# Altium footprint library ATROTECH.PcbLib: 334 footprints (part 7 of 21)
Each footprint in its own frame and in the unit in brackets; x right, y up, seen from the top. Pads: shape width x height; smd on the part's side, far side on the other; paste and mask are expansions set on the pad; w line width, h text height; cw(c..) or ccw(c..) is an arc to the next point about the centre after c.
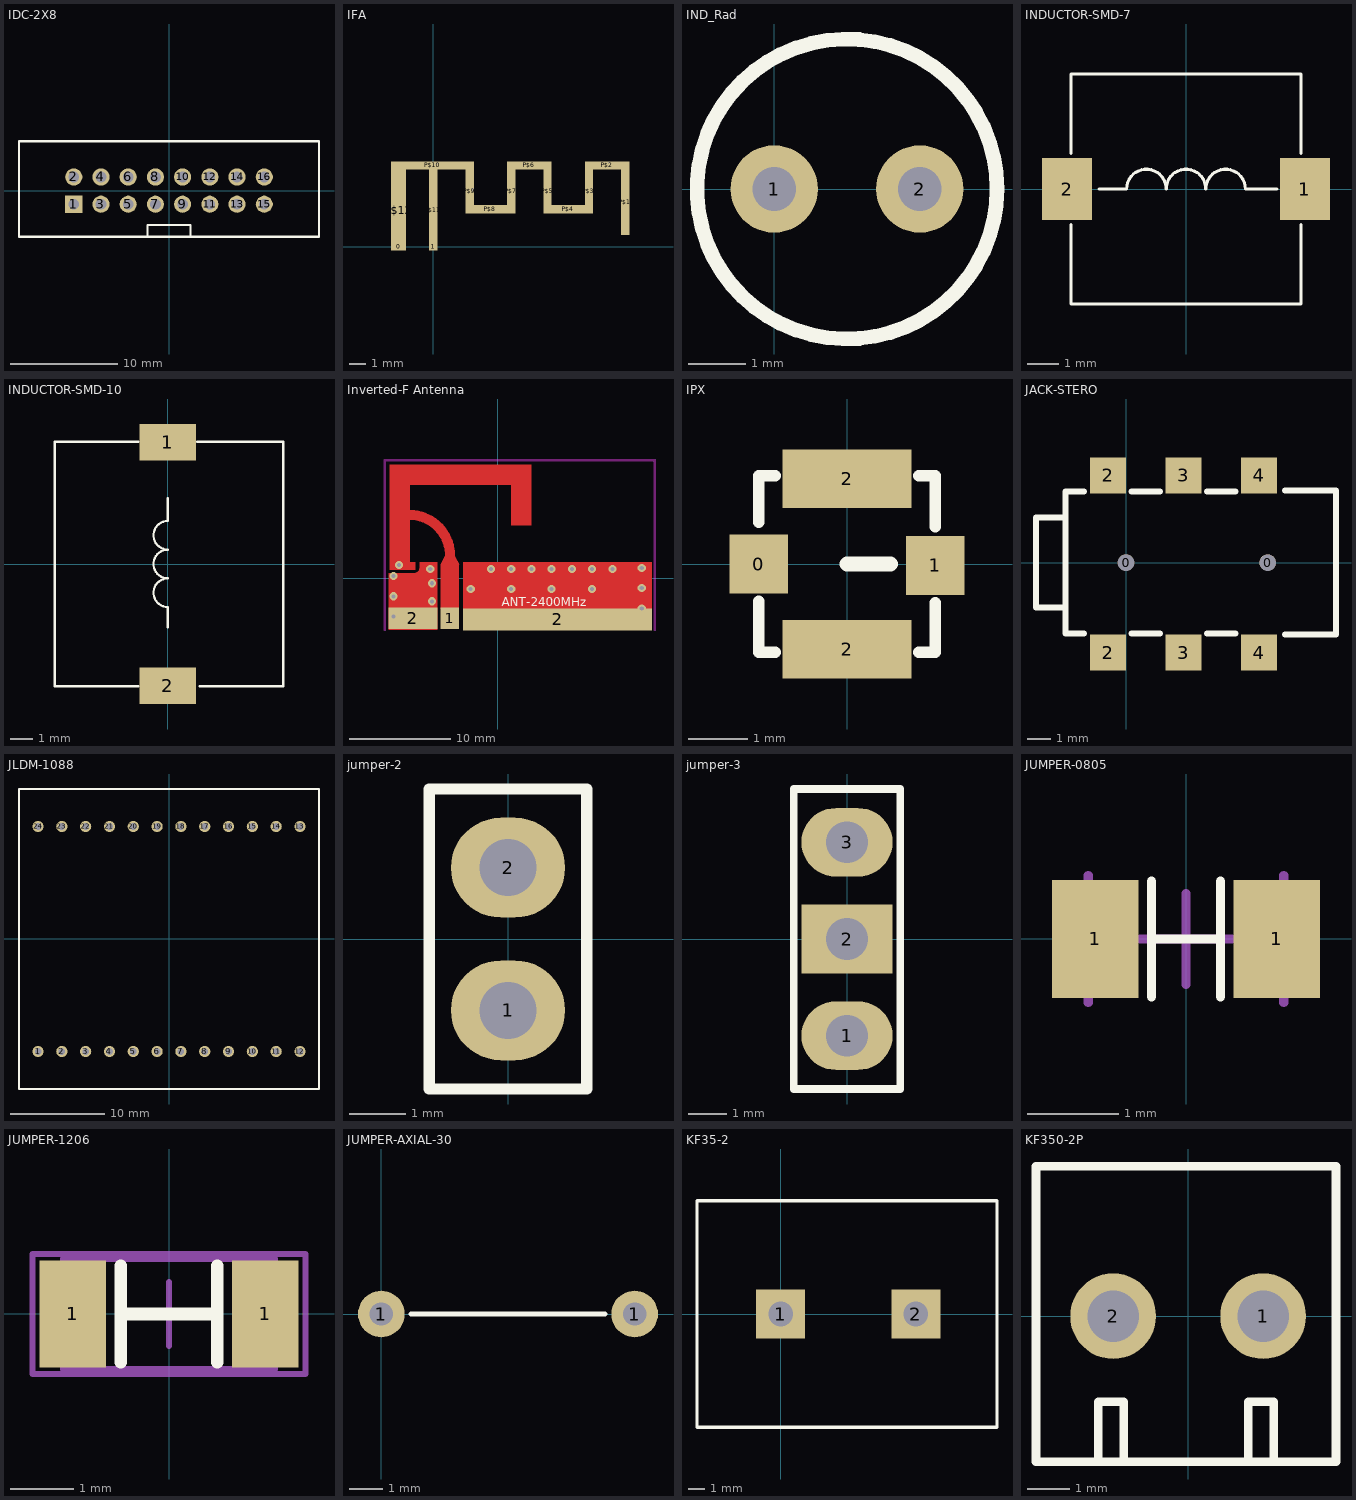
[diagram p6: the footprints below, top view; thin cyan lines are the x and y axes]

## IDC-2X8 [mm]
pads (16):
  rect 1.6x1.6 hole 1: 1(-8.89,-1.27)
  round 1.6 hole 1: 2(-8.89,1.27) 3(-6.35,-1.27) 4(-6.35,1.27) 5(-3.81,-1.27) 6(-3.81,1.27) 7(-1.27,-1.27) 8(-1.27,1.27) 9(1.27,-1.27) 10(1.27,1.27) 11(3.81,-1.27) 12(3.81,1.27) 13(6.35,-1.27) 14(6.35,1.27) 15(8.89,-1.27) 16(8.89,1.27)
Top Overlay:
  lines w0.2: -2,-4.3 -2,-3.2 2,-3.2 2,-4.3 ; -14,-4.3 13.991,-4.3 14,4.6 -14,4.6 -14,-4.3
3D body "User Library-IDC Socket Male 16pin Straight THT Goldplated 2_54mm.step": height 9.13, standoff -3.27, extent -13.96,-4.25 13.96,4.6

## IFA [mm]
pads (14):
  rect 0.9x0.5 smd: 0(-2.1,0)
  rect 0.5x0.5 smd: 1(0,0)
  rect 0.5x3.94 smd: P$1(11.6,2.68)
  rect 2.7x0.5 smd: P$2(10.5,4.9) P$6(5.8,4.9)
  rect 0.5x2.64 smd: P$3(9.4,3.33) P$5(6.9,3.33) P$7(4.7,3.33) P$9(2.2,3.33)
  rect 2x0.5 smd: P$4(8.15,2.26) P$8(3.45,2.26)
  rect 5x0.5 smd: P$10(-0.05,4.9)
  rect 0.5x4.9 smd: P$11(0,2.2)
  rect 0.9x4.9 smd: P$12(-2.1,2.2)

## IND_Rad [mil]
height 196.85
pads (2):
  round 60 hole 30: 1(0,0) 2(100,0)
Top Overlay:
  circle w10: c50,0 r102.96

## INDUCTOR-SMD-7 [mm] "7X7"
pads (2):
  rect 1.6x2 smd: 1(3.81,0) 2(-3.81,0)
Top Overlay:
  lines w0.1: -3.683,-1.143 -3.683,-3.683 3.683,-3.683 3.683,-1.143 ; -3.683,1.143 -3.683,3.683 3.683,3.683 3.683,1.143 ; -2.794,0 -1.905,0 cw(c-1.27,0) -0.635,0 cw(c0,0) 0.635,0 cw(c1.27,0) 1.905,0 2.921,0
3D body "CDRN74.stp": height 4.39, standoff -0.11, extent -3.65,-3.65 3.65,3.65

## INDUCTOR-SMD-10 [mm]
pads (2):
  rect 2.5x1.6 smd: 1(0,5.38) 2(0,-5.38)
Top Overlay:
  lines w0.1: -1.3,-5.4 -5,-5.4 -5,5.4 -1.3,5.4 ; 0,-2.794 0,-1.905 cw(c0,-1.27) 0,-0.635 cw(c0,0) 0,0.635 cw(c0,1.27) 0,1.905 0,2.921 ; 1.3,5.4 5.1,5.4 5.1,-5.4 1.4,-5.4
3D body "10x10mm.step": height 3.97, standoff 0.06, extent -5,-5.38 5,5.38

## Inverted-F Antenna [mil]
pads (3):
  rect 72.44x85.04 smd: 1(-186.51,-155)
  rect 190x85.04 smd: 2(-330,-155)
  rect 735.32x85.04 smd: 2(232.65,-160)
via -384.74,52.66 diameter 31.5 hole 15.75
via -255.91,-19.16 diameter 31.5 hole 15.75
via -262.69,36.91 diameter 31.5 hole 15.75
via -404.93,-148.49 diameter 31.5 hole 15.75
via -404.93,-69.75 diameter 31.5 hole 15.75
via -256.25,-89.19 diameter 31.5 hole 15.75
via -404.93,8.99 diameter 31.5 hole 15.75
via 560.14,-116.63 diameter 31.5 hole 15.75
via 367.23,-41.83 diameter 31.5 hole 15.75
via 209.75,-41.83 diameter 31.5 hole 15.75
via 52.27,-41.83 diameter 31.5 hole 15.75
via 560.14,-37.89 diameter 31.5 hole 15.75
via 52.27,36.91 diameter 31.5 hole 15.75
via 560.14,40.85 diameter 31.5 hole 15.75
via 445.97,36.91 diameter 31.5 hole 15.75
via 367.23,36.91 diameter 31.5 hole 15.75
via 288.49,36.91 diameter 31.5 hole 15.75
via 209.75,36.91 diameter 31.5 hole 15.75
via 131.01,36.91 diameter 31.5 hole 15.75
via -26.47,36.91 diameter 31.5 hole 15.75
via -105.21,-41.83 diameter 31.5 hole 15.75
Top Layer:
  region: 52.27,363.69 52.27,442.43 -420.17,442.43 -420.17,363.69
  region: -341.43,64.47 -341.43,363.69 -420.17,363.69 -420.17,64.47
  region: 131.01,206.21 131.01,442.43 52.27,442.43 52.27,206.21
  rectangle: -420.17,33.37 -320.96,64.47
  rectangle: -135,-200 600.3,64.47
  rectangle: -425,-200 -304.9,20
  rectangle: -304.9,-200 -235,64.47
  rectangle: -222.73,-120 -150.29,-49.17
  rectangle: -222.73,-49.17 -150.29,54.98
  region: -222.73,54.98 -205.72,86.48 -166.83,86.48 -150.29,54.98
  lines w10: -330,15 ccw(c-327.5,42.5) -300,40
  lines w39.37: -340.88,246.95 cw(c-343.48,89.49) -186.02,86.9
Top Overlay:
  text "ANT-2400MHz" at 15,-120 h59.06
Keep-Out Layer:
  lines w10: -440,-200 -440,460 610,460 610,-200

## IPX [mm]
pads (4):
  rect 1x1 smd: 0(-1.5,0) 1(1.5,-0.025)
  rect 2.2x1 smd: 2(0,-1.45) 2(0,1.45)
Top Overlay:
  lines w0.2: -1.5,-0.635 -1.5,-1.5 -1.221,-1.5 ; -1.5,0.711 -1.5,1.5 -1.221,1.5 ; 1.221,-1.5 1.5,-1.5 1.5,-0.66 ; 1.221,1.5 1.5,1.5 1.5,0.635
  lines w0.254: 0,0 0.737,0
3D body "SW3dPS-UFL-R-SMD.STEP": height 1.25, standoff 0, extent -1.55,-1.7 1.55,1.7

## JACK-STERO [mil]
pads (8):
  round 27.56 hole 27.56: 0(0,0) 0(236.22,0)
  rect 60x60 smd: 2(-30,-150) 2(-30,145.28) 3(95.98,-150) 3(95.98,145.28) 4(221.97,-150) 4(221.97,145.28)
Top Overlay:
  lines w10: -100.87,-75 -150,-75 -150,75 -100.87,75 ; -70.28,118.11 -100.87,118.11 -100.87,0 -100.87,-118.11 -70,-118.11 ; 9.09,118.11 56.34,118.11 ; 9.37,-118.11 56.61,-118.11 ; 135.08,118.11 182.32,118.11 ; 135.35,-118.11 182.6,-118.11 ; 265,-120 350,-120 350,120 265,120
3D body "User Library-audio_buchse.step": height 160, standoff -0.39, extent -160.63,-145 310.63,143.74

## JLDM-1088 [mm]
pads (24):
  round 1.2 hole 0.7: 1(-13.97,-12) 2(-11.43,-12) 3(-8.89,-12) 4(-6.35,-12) 5(-3.81,-12) 6(-1.27,-12) 7(1.27,-12) 8(3.81,-12) 9(6.35,-12) 10(8.89,-12) 11(11.43,-12) 12(13.97,-12) 13(13.97,12) 14(11.43,12) 15(8.89,12) 16(6.35,12) 17(3.81,12) 18(1.27,12) 19(-1.27,12) 20(-3.81,12) 21(-6.35,12) 22(-8.89,12) 23(-11.43,12) 24(-13.97,12)
Top Overlay:
  lines w0.2: -16,-16 -16,16 16,16 16,-16 -16,-16
3D body: height 6, standoff 0, extent -16,-16 16,16

## jumper-2 [mil]
pads (2):
  oval 80x70 hole 40: 1(0,-50) 2(0,50)
Top Overlay:
  lines w7.87: -55.12,-105.12 -55.12,105.12 55.12,105.12 55.12,-105.12 -55.12,-105.12
3D body "header02.STEP": height 330, standoff -100, extent -50,-100 50,100
3D body "jumper_akspt_g-grey.STEP": height 337.4, standoff 102.36, extent -48.03,-98.03 48.03,98.03

## jumper-3 [mm]
pads (3):
  oval 2.4x1.8 hole 1.1: 1(0,-2.54) 3(0,2.54)
  rect 2.4x1.8 hole 1.1: 2(0,0)
Top Overlay:
  lines w0.2: -1.4,-3.94 1.4,-3.94 1.4,3.94 -1.4,3.94 -1.4,-3.94
3D body: height 10.16, standoff 3.05, extent -1.27,-3.785 1.27,1.295
3D body "Header3.STEP": height 8.38, standoff -2.54, extent -1.27,-3.785 1.27,3.835

## JUMPER-0805 [mm]
pads (2):
  rect 0.95x1.3 smd: 1(-1,0) 1(1,0)
Top Overlay:
  lines w0.1: -0.381,-0.635 -0.381,0.635 ; -0.381,0 0.381,0 ; 0.381,-0.635 0.381,0.635
Mechanical 13:
  lines w0.1: -1.075,-0.7 -1.075,0.7 ; 1.075,-0.7 1.075,0.7
Mechanical 15:
  lines w0.1: -0.5,0 0.5,0 ; 0,-0.5 0,0.5
3D body "0805.STEP": height 0.6, standoff 0, extent -1.016,-0.635 1.016,0.635

## JUMPER-1206 [mm]
pads (2):
  rect 1.05x1.7 smd: 1(-1.524,0) 1(1.524,0)
Top Overlay:
  lines w0.2: -0.762,-0.762 -0.762,0.762 ; -0.762,0 0.762,0 ; 0.762,-0.762 0.762,0.762
Mechanical 13:
  lines w0.1: -1.675,-0.875 -1.675,0.875 1.675,0.875 1.675,-0.875 -1.675,-0.875
Mechanical 15:
  lines w0.1: -0.5,0 0.5,0 ; 0,-0.5 0,0.5 ; -2.159,-0.95 -2.159,0.95 2.159,0.95 2.159,-0.95 -2.159,-0.95
3D body "1206.STEP": height 0.6, standoff 0, extent -1.524,-0.762 1.524,0.762

## JUMPER-AXIAL-30 [mm]
pads (2):
  round 1.4 hole 0.7: 1(0,0) 1(7.62,0)
Top Overlay:
  lines w0.15: 0.889,0 6.731,0
3D body "Resistor Zero.STEP": height 2.5, standoff -2.3, extent -0.4,-1.2 8.02,1.2

## KF35-2 [mm]
pads (2):
  rect 3x3 hole 1.5: 1(0,0) 2(8.25,0)
Top Overlay:
  lines w0.2: -5.1,-6.9 -5.1,6.9 13.2,6.9 13.2,-6.9 -5.1,-6.9
3D body "KF35.STEP": height 14.87, standoff -3.93, extent -5.056,-6.9 13.256,6.9

## KF350-2P [mm]
pads (2):
  round 2 hole 1.2: 1(1.75,0) 2(-1.75,0)
Top Overlay:
  lines w0.2: -2.1,-3.4 -2.1,-2 -1.5,-2 -1.5,-3.4 ; 1.4,-3.4 1.4,-2 2,-2 2,-3.4 ; -3.55,3.5 3.45,3.5 3.45,-3.4 -3.55,-3.4 -3.55,3.5 ; -3.55,3.5 -3.55,3.5
3D body "User Library-KF350-2P.STEP": height 8.8, standoff -2.6, extent -3.55,-3.4 3.45,3.5